# Altium integrated library Mastermind Devices.IntLib: 910 symbols (part 3 of 6)
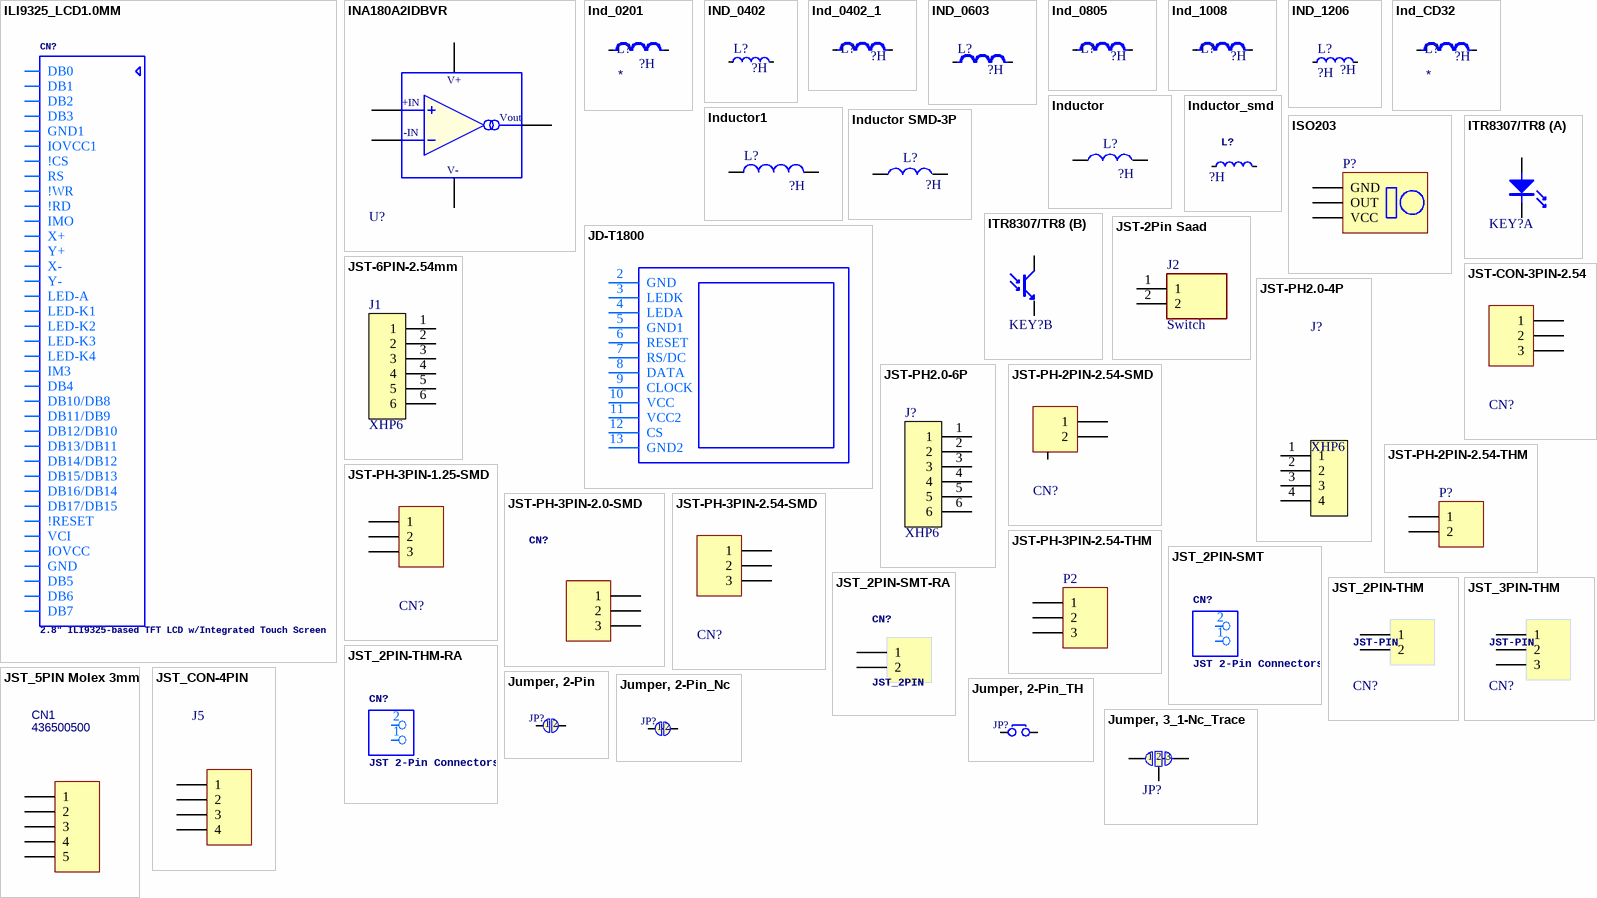
[diagram p41: symbols ILI9325_LCD1.0MM to Jumper, 3_1-Nc_Trace]

## Inductor
designator L?  value ?H  (hidden comment: *)
footprint I1206K - Inductor
footprint 82114R
footprint 0207/2V
footprint INDUCTOR_4X4MM_SMD
footprint INDUCTOR_7X7MM_SMD
footprint INDUCTOR_10X10MM_SMD - duplicate
footprint IND-SMD_L6.0-W6.0
footprint IND-SMD_L12.3-W12.3
footprint IND-SMD_L4.0-W4.0_SMNR4020
footprint TORIDAL-D27_W13
footprint TORIDAL-L48_W34
footprint TORIDAL-L66_W50
footprint SM5845
footprint TORIDAL-D13_3A
footprint IND-SMD_L5.8-W5.2
footprint INDUCTOR_14X14MM_SMD
pins: 1, 2

## Inductor1
designator L?  value ?H  (hidden comment: *)
Inductor; Code_IEC: 1005; Published: 8-Jun-2000; LatestRevisionDate: 29-May-2009; LatestRevisionNote: IPC-7351 Footprint Added.; PackageReference: 0402-A; Publisher: Altium Limited; PackageDescription: Chip Inductor; Code_JEITA: 0402
footprint 0402-A (Chip Inductor, Body 1.0x0.5mm, IPC High Density)
footprint INDC1608L (Chip Inductor, Body 1.6x0.8mm, IPC High Density)
footprint 2029 (Chip Inductor, Body 2.0x1.2mm, IPC High Density)
footprint 0603 (Chip Inductor, Body 0.6x0.3mm, IPC High Density)
footprint INDC3216 (Chip Inductor, Body 3.2x1.6mm, IPC High Density)
footprint INDC4532 (Chip Inductor, Body 4.5x3.2mm, IPC High Density)
simulation model INDUCTOR (Inductor)
signal-integrity model Inductor
pins: 1, 2

## Inductor SMD-3P
designator L?  value ?H  (hidden comment: *)
SMD-3P, Power Inductors ROHS
footprint IND-SMD_3P-L12.7-W12.5
footprint IND-SMD_3P-L27.9-W19.7-P10.43-LS27.9-BL-A
pins: 1, 2, 3 GND hidden to GND

## Inductor_smd
designator L?  value ?H  (hidden comment: *)
Chip inductor
footprint INDC-0603
pins: 1, 2

## ISO203
designator P?
Header, 3-Pin; LatestRevisionDate: 17-Jul-2002; LatestRevisionNote: Re-released for DXP Platform.; Publisher: Altium Limited
footprint ISO203 (Connector; Header; 3 Position)
pins: 1 GND, 2 OUT, 3 VCC

## ITR8307/TR8
designator KEY?  (value not drawn)
Manufacturer: EVERLIGHT(亿光); Supplier: LCSC; Manufacturer Part: ITR8307/TR8; Supplier Part: C67922; JLCPCB Part Class: Extended Part; spicePre: K; spiceSymbolName: ITR8307/TR8
footprint OPTO-4P-L3.4-W2.7-P1.30-LS4.6
part A pins: 1 K "Cathode", 2 A "Anode"
part B pins: 3 C "Collector", 4 E "Emitter"

## JD-T1800
designator LCD?
footprint JD-T1800
pins: 2 GND (power), 3 LEDK, 4 LEDA, 5 GND1 (power), 6 RESET, 7 RS/DC, 8 DATA, 9 CLOCK, 10 VCC (power), 11 VCC2 (power), 12 CS, 13 GND2 (power)

## JST-2Pin Saad
designator J2, comment Switch
Connector Header Through Hole 2 position 0.098 (2.50mm); DETAILS: Connector Header Through Hole 2 position 0.098" (2.50mm); MFG: JST Sales America Inc.; MFGPN: B2B-XH-A(LF)(SN); PACKAGE: CONN HEADER VERT 2POS 2.5MM; URL: https://www.digikey.com/en/products/detail/jst-sales-america-inc/B2B-XH-A-LF-SN/1651045?s=N4IgTCBcDaIEJjgWgBoAkkEEAUAZAYgJTYDKAcoSALoC%2BQA
footprint JST_B2B-XH-A(LF)(SN)
pins: 1, 2

## JST-6PIN-2.54mm
designator J1, comment XHP6
footprint JST_B6B-XH-A(LF)(SN)
pins: 1, 2, 3, 4, 5, 6

## JST-CON-3PIN-2.54
designator CN?, comment ZX-XH2.54-3PWT  (value not drawn)
Manufacturer: Megastar(兆星); Contributor: lcsc; Supplier: LCSC; Supplier Part: C7429672; Manufacturer Part: ZX-XH2.54-3PWT; JLCPCB Part Class: Extended Part; spicePre: C; spiceSymbolName: ZX-XH2.54-3PWT
footprint JST_B3B-XH-A(LF)(SN)
pins: 1, 2, 3

## JST-PH2.0-4P
designator J?, comment XHP6
footprint JST-PH2.0-4PINS
pins: 1, 2, 3, 4

## JST-PH2.0-6P
designator J?, comment XHP6
footprint JST-PH2.0-6PINS
pins: 1, 2, 3, 4, 5, 6

## JST-PH-2PIN-2.54-SMD
designator CN?, comment ZX-XH2.54-2PWT  (value not drawn)
Manufacturer: Megastar(兆星); Contributor: lcsc; Supplier: LCSC; Supplier Part: C7429671; Manufacturer Part: ZX-XH2.54-2PWT; JLCPCB Part Class: Extended Part; spicePre: C; spiceSymbolName: ZX-XH2.54-2PWT
footprint CONN-SMD_2P-P2.54_MEGASTAR_ZX-XH2.54-2PWT
pins: 1, 2, M

## JST-PH-2PIN-2.54-THM
designator P?, comment Header 2  (value not drawn)
Header, 2-Pin; LatestRevisionDate: 17-Jul-2002; LatestRevisionNote: Re-released for DXP Platform.; Publisher: Altium Limited
footprint JST-PH-2PIN-2.54-THM
pins: 1, 2

## JST-PH-3PIN-1.25-SMD
designator CN?, comment ZX-XH2.54-3PWT  (value not drawn)
Manufacturer: Megastar(兆星); Contributor: lcsc; Supplier: LCSC; Supplier Part: C7429672; Manufacturer Part: ZX-XH2.54-3PWT; JLCPCB Part Class: Extended Part; spicePre: C; spiceSymbolName: ZX-XH2.54-3PWT
footprint CONN-TH_SM03B-GHS-TB-LF-SN
pins: 1, 2, 3, 4 GND hidden to GND, 5 GND hidden to GND

## JST-PH-3PIN-2.0-SMD
designator CN?
footprint JSTPH3
pins: 1, 2, 3

## JST-PH-3PIN-2.54-SMD
designator CN?, comment ZX-XH2.54-3PWT  (value not drawn)
Manufacturer: Megastar(兆星); Contributor: lcsc; Supplier: LCSC; Supplier Part: C7429672; Manufacturer Part: ZX-XH2.54-3PWT; JLCPCB Part Class: Extended Part; spicePre: C; spiceSymbolName: ZX-XH2.54-3PWT
footprint CONN-SMD_3P-P2.54-XH2.54-WT
pins: 1, 2, 3, M GND hidden

## JST-PH-3PIN-2.54-THM
designator P2, comment Header 3  (value not drawn)
Header, 3-Pin; LatestRevisionDate: 17-Jul-2002; LatestRevisionNote: Re-released for DXP Platform.; Publisher: Altium Limited
footprint JST-PH-3PIN-2.54-THM
pins: 1, 2, 3

## JST_2PIN-SMT
designator CN?, comment JST 2-Pin Connectors of various flavors SMT-RA (S2B-PH-SM4) 4UConnector #17311  SMT  (B2B-PH-SM4)  THM-RA (S2B-PH)  THM  (B2B-PH)
footprint JST-PH-2-SMT
pins: 1 2, 2 1

## JST_2PIN-SMT-RA
designator CN?, comment JST_2PIN
JST 2-Pin Connectors of various flavors SMT-RA (S2B-PH-SM4) 4UConnector #17311  SMT  (B2B-PH-SM4)  THM-RA (S2B-PH)  THM  (B2B-PH)
footprint JST-PH-2-SMT-RA
pins: 1, 2

## JST_2PIN-THM
designator CN?, comment JST-PIN
footprint JST-2-PTH-THM - VERTICAL
pins: 1, 2

## JST_2PIN-THM-RA
designator CN?, comment JST 2-Pin Connectors of various flavors SMT-RA (S2B-PH-SM4) 4UConnector #17311  SMT  (B2B-PH-SM4)  THM-RA (S2B-PH)  THM  (B2B-PH)
footprint JST-PH-2-THM-RA
pins: 1 2, 2 1

## JST_3PIN-THM
designator CN?, comment JST-PIN
footprint JST-3-PTH-THM - VERTICAL
pins: 1, 2, 3

## JST_5PIN Molex 3mm
designator CN1, comment 436500500
BOM_Manufacturer: MOLEX; Contributor: LCSC; BOM_Supplier: LCSC; BOM_Supplier Part: C492351; BOM_Manufacturer Part: 436500500; BOM_JLCPCB Part Class: Extended Part; spicePre: C; spiceSymbolName: 436500500
footprint CONN-TH_436500500
pins: 1, 2, 3, 4, 5

## JST_CON-4PIN
designator J5
4 Position Wire to Board Terminal Block Horizontal with Board 0.100 _2.54mm_ Through Hole; DETAILS: Connector Header Through Hole 4 position 0.098" (2.50mm); MFG: JST Sales America Inc.; MFGPN: B4B-XH-A(LF)(SN); PACKAGE: 4POS 2.5MM; URL: https://www.digikey.com/en/products/detail/jst-sales-america-inc/B4B-XH-A-LF-SN/1651047
footprint JST_B4B-XH-A(LF)(SN)
pins: 1, 2, 3, 4

## Jumper, 2-Pin
designator JP?, comment GND  (value not drawn)  (no BOM)
Jumper, 2-Pin
footprint JUMPER-SB
footprint Jumper-NO
footprint SB_0603 (Jumper)
pins: 1, 2

## Jumper, 2-Pin_Nc
designator JP?, comment Shorting Link  (value not drawn)  (no BOM)
Jumper, 2-Pin
footprint Jumper-NC
footprint JUMPER-NC1
pins: 1, 2

## Jumper, 2-Pin_TH
designator JP?, comment Jumper, 2-Pin  (value not drawn)
footprint JUMPER-2PIN
pins: 1, 2

## Jumper, 3_1-Nc_Trace
designator JP?, comment JUMPER-SMT_3_1-NC_TRACE_NO-SILK  (value not drawn)  (no BOM)
GateName_1: G$1; SymbolName_1: SMT-JUMPER_3_1-NC_TRACE; DeviceName: _NO-SILK; LibraryName: SparkFun-Jumpers; DeviceSetName: JUMPER-SMT_3_1-NC_TRACE
footprint JUMPER_3_2-NC_TRACE_SILK (SMT-JUMPER_3_2-NC_TRACE_SILK)
pins: 1, 2, 3

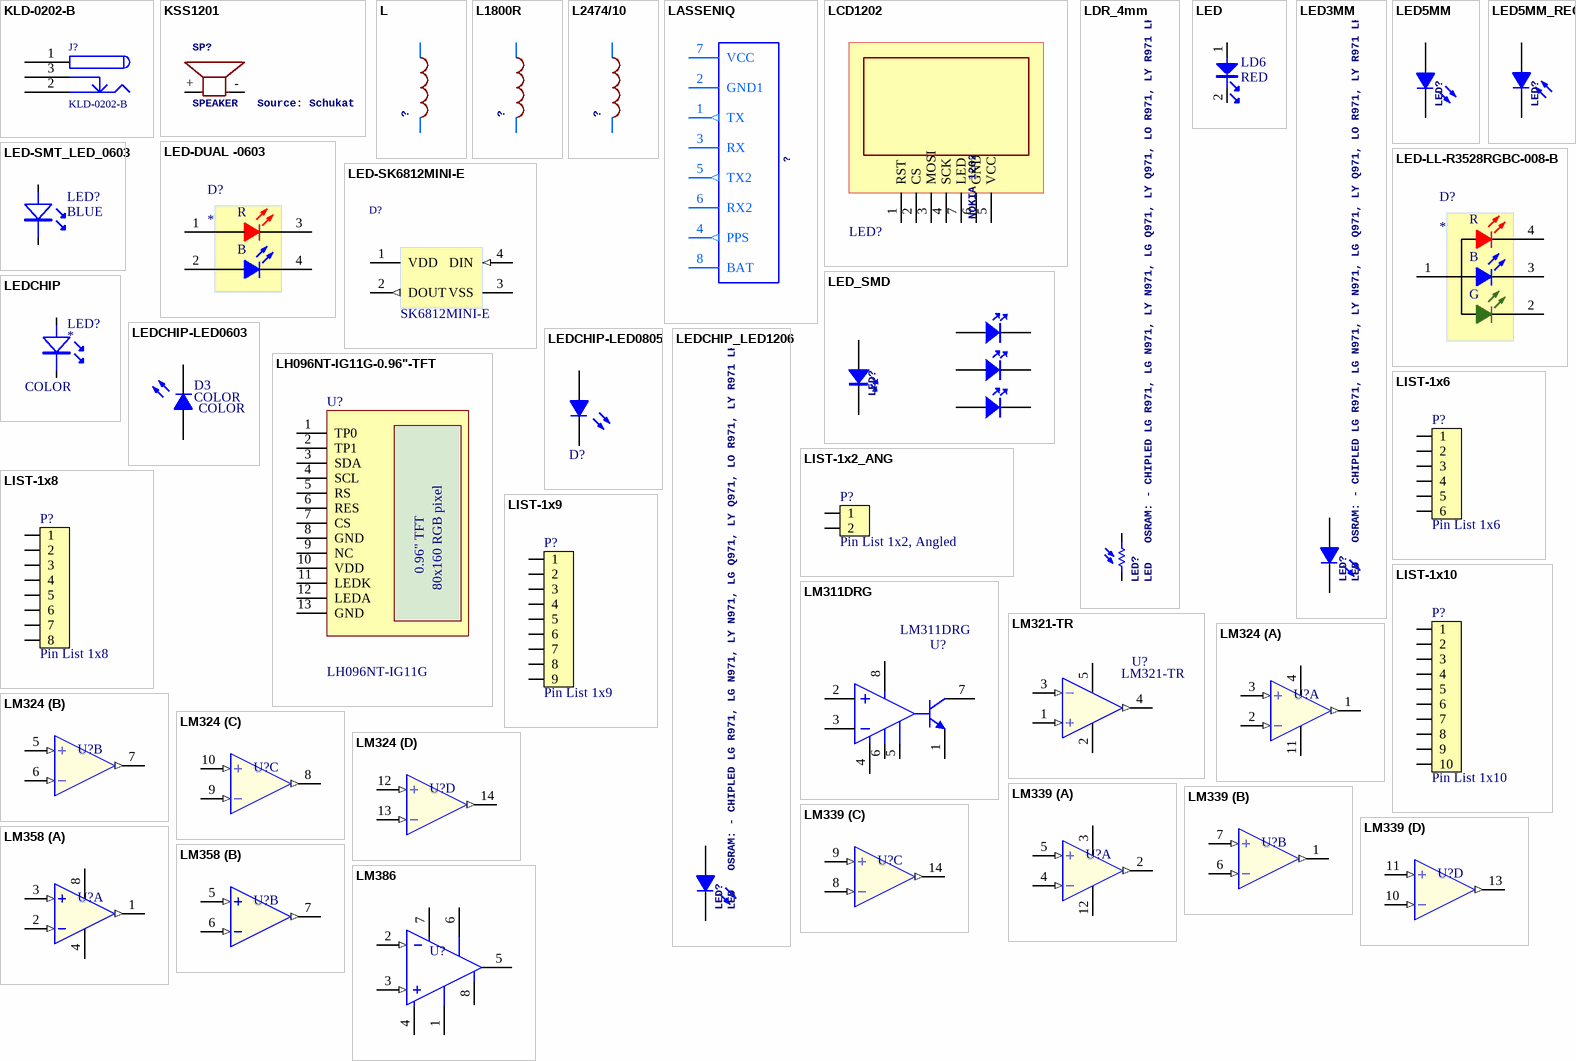
[diagram p16: symbols KLD-0202-B to LM386]

## KLD-0202-B
designator J?
Low Voltage Power Supply Connector; Manufacturer: Kycon; AEMS Code: 3510211
3D model power_jack (PCB3D Model)
footprint KLD-0202
pins: 1 (power), 2 (power), 3 (power)

## KSS1201
designator SP?, comment SPEAKER   Source: Schukat
OC_FARNELL: unknown; OC_NEWARK: unknown
footprint KSS1201
pins: + 1, - 2

## L
designator ?
footprint 6000
pins: 1, 2

## L1800R
designator ?
footprint 1800R
pins: 1, 2

## L2474/10
designator ?
footprint 2747
pins: P$1 1, P$2 2

## LASSENIQ
designator ?
footprint TRIMBLE
pins: 1 TX (out), 2 GND1 (oe), 3 RX, 4 PPS (out), 5 TX2 (out), 6 RX2, 7 VCC (oe), 8 BAT (oe)

## LCD1202
designator LED?, comment NOKIA 1202
footprint LCD1202
pins: 1 RST, 2 CS, 3 MOSI, 4 SCK, 5 VCC, 6 GND, 7 LED

## LDR_4mm
designator LED?, comment LED   OSRAM: - CHIPLED LG R971, LG N971, LY N971, LG Q971, LY Q971, LO R971, LY R971 LH N974, LH R974 LS Q976, LO Q976, LY Q976 LO Q996 - Hyper CHIPLED LW Q18S LB Q993, LB Q99A, LB R99A - SideLED LS A670, LO A670, LY A670, LG A670, LP A670 LB A673, LV A673, LT A673, LW A673 LH A674 LY A675 LS A676, LA A676, LO A676, LY A676, LW A676 LS A679, LY A679, LG A679 -  Hyper Micro SIDELEDÂ® LS Y876, LA Y876, LO Y876, LY Y876 LT Y87S - SmartLED LW L88C, LW L88S LB L89C, LB L89S, LG L890 LS L89K, LO L89K, LY L89K LS L896, LA L896, LO L896, LY L896 - TOPLED LS T670, LO T670, LY T670, LG T670, LP T670 LSG T670, LSP T670, LSY T670, LOP T670, LYG T670 LG T671, LOG T671, LSG T671 LB T673, LV T673, LT T673, LW T673 LH T674 LS T676, LA T676, LO T676, LY T676, LB T676, LH T676, LSB T676, LW T676 LB T67C, LV T67C, LT T67C, LS T67K, LO T67K, LY T67K, LW E67C LS E67B, LA E67B, LO E67B, LY E67B, LB E67C, LV E67C, LT E67C LW T67C LS T679, LY T679, LG T679 LS T770, LO T770, LY T770, LG T770, LP T770 LB T773, LV T773, LT T773, LW T773 LH T774 LS E675, LA E675, LY E675, LS T675 LS T776, LA T776, LO T776, LY T776, LB T776 LHGB T686 LT T68C, LB T68C - Hyper Mini TOPLEDÂ® LB M676 - Mini TOPLED SantanaÂ® LG M470 LS M47K, LO M47K, LY M47K    Source: http://www.osram.convergy.de/
footprint LDR-4mm
pins: 1, 2

## LED
designator LD6, comment RED
Manuf_Part_1: 19-213-R6C-AP1Q2B-3T; Manuf_1: EVERLIGHT
pins: 1, 2
2 alternate drawings of the same symbol

## LED3MM
designator LED?, comment LED   OSRAM: - CHIPLED LG R971, LG N971, LY N971, LG Q971, LY Q971, LO R971, LY R971 LH N974, LH R974 LS Q976, LO Q976, LY Q976 LO Q996 - Hyper CHIPLED LW Q18S LB Q993, LB Q99A, LB R99A - SideLED LS A670, LO A670, LY A670, LG A670, LP A670 LB A673, LV A673, LT A673, LW A673 LH A674 LY A675 LS A676, LA A676, LO A676, LY A676, LW A676 LS A679, LY A679, LG A679 -  Hyper Micro SIDELEDÂ® LS Y876, LA Y876, LO Y876, LY Y876 LT Y87S - SmartLED LW L88C, LW L88S LB L89C, LB L89S, LG L890 LS L89K, LO L89K, LY L89K LS L896, LA L896, LO L896, LY L896 - TOPLED LS T670, LO T670, LY T670, LG T670, LP T670 LSG T670, LSP T670, LSY T670, LOP T670, LYG T670 LG T671, LOG T671, LSG T671 LB T673, LV T673, LT T673, LW T673 LH T674 LS T676, LA T676, LO T676, LY T676, LB T676, LH T676, LSB T676, LW T676 LB T67C, LV T67C, LT T67C, LS T67K, LO T67K, LY T67K, LW E67C LS E67B, LA E67B, LO E67B, LY E67B, LB E67C, LV E67C, LT E67C LW T67C LS T679, LY T679, LG T679 LS T770, LO T770, LY T770, LG T770, LP T770 LB T773, LV T773, LT T773, LW T773 LH T774 LS E675, LA E675, LY E675, LS T675 LS T776, LA T776, LO T776, LY T776, LB T776 LHGB T686 LT T68C, LB T68C - Hyper Mini TOPLEDÂ® LB M676 - Mini TOPLED SantanaÂ® LG M470 LS M47K, LO M47K, LY M47K    Source: http://www.osram.convergy.de/
footprint LED3MM
pins: A, K

## LED5MM
designator LED?
footprint LED5MM
footprint LED5MM1
pins: A, K

## LED5MM_REC
designator LED?
footprint LED5MM
footprint LED5MM1
pins: A, K

## LED-DUAL -0603
designator D?
0603 1.6*1.5mm; MF: Lucky Light; MP: LL-R3528RGBC-008-B; Package: PLCC-2 Lucky Light; Availability: Unavailable; Value: *; SnapEDA_Link: https://www.snapeda.com/parts/LL-R3528RGBC-008-B/Lucky%20Light/view-part/47649/?ref=snap; Price: None
footprint LED_DUAL_0606 - touch
footprint LED_DUAL_0606
pins: 1 A, 2 A, 3 K, 4 K
text: R; B

## LED-LL-R3528RGBC-008-B
designator D?
LED; SMD; 3528, PLCC2; RGB; 3.5x2.8mm; 120Â°; Red lumin: 1; MF: Lucky Light; MP: LL-R3528RGBC-008-B; Package: PLCC-2 Lucky Light; Availability: Unavailable; Value: *; SnapEDA_Link: https://www.snapeda.com/parts/LL-R3528RGBC-008-B/Lucky%20Light/view-part/47649/?ref=snap; Price: None
footprint LED_LL-R3528RGBC-008-B
pins: 1 A, 2 K, 3 K, 4 K
text: R; B; G

## LED-SK6812MINI-E
designator D?  Name: SK6812MINI-E
SMD RGB LED
footprint LED_SK6812MINI-E
pins: 1 VDD, 2 DOUT (out), 3 VSS, 4 DIN (in)

## LED-SMT_LED_0603
designator LED?, comment BLUE
SMT LED
footprint CHIPLED_0603
pins: A, C K

## LED_SMD
designator LED?, comment LED   OSRAM: - CHIPLED LG R971, LG N971, LY N971, LG Q971, LY Q971, LO R971, LY R971 LH N974, LH R974 LS Q976, LO Q976, LY Q976 LO Q996 - Hyper CHIPLED LW Q18S LB Q993, LB Q99A, LB R99A - SideLED LS A670, LO A670, LY A670, LG A670, LP A670 LB A673, LV A673, LT A673, LW A673 LH A674 LY A675 LS A676, LA A676, LO A676, LY A676, LW A676 LS A679, LY A679, LG A679 -  Hyper Micro SIDELEDÂ® LS Y876, LA Y876, LO Y876, LY Y876 LT Y87S - SmartLED LW L88C, LW L88S LB L89C, LB L89S, LG L890 LS L89K, LO L89K, LY L89K LS L896, LA L896, LO L896, LY L896 - TOPLED LS T670, LO T670, LY T670, LG T670, LP T670 LSG T670, LSP T670, LSY T670, LOP T670, LYG T670 LG T671, LOG T671, LSG T671 LB T673, LV T673, LT T673, LW T673 LH T674 LS T676, LA T676, LO T676, LY T676, LB T676, LH T676, LSB T676, LW T676 LB T67C, LV T67C, LT T67C, LS T67K, LO T67K, LY T67K, LW E67C LS E67B, LA E67B, LO E67B, LY E67B, LB E67C, LV E67C, LT E67C LW T67C LS T679, LY T679, LG T679 LS T770, LO T770, LY T770, LG T770, LP T770 LB T773, LV T773, LT T773, LW T773 LH T774 LS E675, LA E675, LY E675, LS T675 LS T776, LA T776, LO T776, LY T776, LB T776 LHGB T686 LT T68C, LB T68C - Hyper Mini TOPLEDÂ® LB M676 - Mini TOPLED SantanaÂ® LG M470 LS M47K, LO M47K, LY M47K    Source: http://www.osram.convergy.de/  (value not drawn)
footprint CHIPLED_0603
pins: A, A, A, A, C K, C K, C K, C K

## LEDCHIP
designator LED?  value COLOR
SMD lamp beads
footprint CHIP-LED0603
footprint CHIPLED_0603
footprint KA-3528ASYC
footprint CHIPLED_0603 - NO
footprint CHIP-LED0805-NO
footprint CHIP-LED0805
pins: A, C K

## LEDCHIP-LED0603
designator D3, comment COLOR
SMD lamp beads; Value: COLOR
footprint CHIP-LED0603
footprint CHIPLED_0603
footprint KA-3528ASYC
footprint CHIPLED_0603 - NO
pins: A, C K

## LEDCHIP-LED0805
designator D?  (value not drawn)
SMD Lamp beads; Value: COLOR
footprint CHIP-LED0805
footprint CHIP-LED0805-NO
pins: A, C

## LEDCHIP_LED1206
designator LED?, comment LED   OSRAM: - CHIPLED LG R971, LG N971, LY N971, LG Q971, LY Q971, LO R971, LY R971 LH N974, LH R974 LS Q976, LO Q976, LY Q976 LO Q996 - Hyper CHIPLED LW Q18S LB Q993, LB Q99A, LB R99A - SideLED LS A670, LO A670, LY A670, LG A670, LP A670 LB A673, LV A673, LT A673, LW A673 LH A674 LY A675 LS A676, LA A676, LO A676, LY A676, LW A676 LS A679, LY A679, LG A679 -  Hyper Micro SIDELEDÂ® LS Y876, LA Y876, LO Y876, LY Y876 LT Y87S - SmartLED LW L88C, LW L88S LB L89C, LB L89S, LG L890 LS L89K, LO L89K, LY L89K LS L896, LA L896, LO L896, LY L896 - TOPLED LS T670, LO T670, LY T670, LG T670, LP T670 LSG T670, LSP T670, LSY T670, LOP T670, LYG T670 LG T671, LOG T671, LSG T671 LB T673, LV T673, LT T673, LW T673 LH T674 LS T676, LA T676, LO T676, LY T676, LB T676, LH T676, LSB T676, LW T676 LB T67C, LV T67C, LT T67C, LS T67K, LO T67K, LY T67K, LW E67C LS E67B, LA E67B, LO E67B, LY E67B, LB E67C, LV E67C, LT E67C LW T67C LS T679, LY T679, LG T679 LS T770, LO T770, LY T770, LG T770, LP T770 LB T773, LV T773, LT T773, LW T773 LH T774 LS E675, LA E675, LY E675, LS T675 LS T776, LA T776, LO T776, LY T776, LB T776 LHGB T686 LT T68C, LB T68C - Hyper Mini TOPLEDÂ® LB M676 - Mini TOPLED SantanaÂ® LG M470 LS M47K, LO M47K, LY M47K    Source: http://www.osram.convergy.de/
Value: COLOR
footprint CHIPLED_1206
pins: A, C

## LH096NT-IG11G-0.96"-TFT
designator U?, comment LH096NT-IG11G
TFT ST7735S Display ROHS; Manufacturer: Newvision(新智景); Symbol: N087-2832TSWYG02-H14; Add into BOM: yes; Device: N087-2832TSWYG02-H14; LCSC Part Name: 0.87寸 白光 128x32像素分辨率 14PIN; Manufacturer Part: N087-2832TSWYG02-H14; Supplier Footprint: -; JLCPCB Part Class: Extended Part; Datasheet: https://atta.szlcsc.com/upload/public/pdf/source/20220801/014279878C5155A8BB30742A627C84A8.pdf; Supplier: LCSC; Convert to PCB: yes
footprint LH096NT-IG11G
pins: 1 TP0, 2 TP1, 3 SDA, 4 SCL, 5 RS, 6 RES, 7 CS, 8 GND, 9 NC, 10 VDD, 11 LEDK, 12 LEDA, 13 GND
text: 0.96" TFT; 80x160 RGB pixel

## LIST-1x2_ANG
designator P?, comment Pin List 1x2, Angled
Pin List 1x2, 2.54mm (100mil), Right Angled, SMD; Part Number: Pin List Ang 1x2 SMD, 2.54mm; Manufacturer: W-CON; Manufacturer Part Number: 1125B-1102S0ZZ135R1; 2nd source part number: TSM-102-01-L-SH-A; Artikkelnr Noca: 55010023; Artikkelnr Simpro: N.A.; Datasheet: \\hizz\pro\app9717\Datasheet\connectores\W-CON\1125B-11XXXXZXXXXX.pdf; Footprint Doc: LIST_ANG_1x2-SMD-2.54MM; LatestRevisionDate: 2016-01-22; Pin Count: 2; Publisher: Nordic Semiconductor; Published: 2016-01-22; Value: Pin List 1x2, Angled; Note: *; Supplier: Cabcon; Supplier part number: 1125B-1102S0ZZ135R1; 2nd source Supplier: Samtec
footprint LIST_ANG_1x2-SMD-2.54MM
pins: 1, 2

## LIST-1x6
designator P?, comment Pin List 1x6
Pin List 1x6, 2.54mm (100mil), SMD; Part Number: Pin List 1x6 SMD; Note: Not mounted; Artikkelnr Noca: 55019252; Artikkelnr Simpro: N.A.; Manufacturer: *; Manufacturer Part Number: *; Datasheet: *; LatestRevisionDate: 2013-08-27; Pin Count: 6; Publisher: Nordic Semiconductor; Published: 2013-08-27; Value: Pin List 1x6; Supplier: Samtec; Supplier part number: TSM-106-01-L-SV-P-TR; 2nd source Supplier: *; 2nd source part number: *; Footprint Doc: LIST_1x6_SMD
footprint LIST_1x6_SMD
pins: 1, 2, 3 (power), 4 (power), 5 (power), 6 (power)

## LIST-1x8
designator P?, comment Pin List 1x8
Pin List 1x8, 2.54mm (100mil), SMD; Part Number: Pin List 1x8 SMD; Note: Not mounted; Artikkelnr Noca: 55019253; Artikkelnr Simpro: N.A.; Manufacturer: *; Manufacturer Part Number: *; Datasheet: *; LatestRevisionDate: 2013-08-27; Publisher: Nordic Semiconductor; Published: 2013-08-27; Value: Pin List 1x8; Supplier: Samtec; Supplier part number: TSM-108-01-L-SV-P-TR; 2nd source Supplier: *; 2nd source part number: *; Pin Count: 8; Footprint Doc: LIST_1x8_SMD
footprint LIST_1x8_SMD
pins: 1, 2, 3 (power), 4 (power), 5 (power), 6 (power), 7 (power), 8 (power)

## LIST-1x9
designator P?, comment Pin List 1x9
Pin List 1x9, 2.54mm (100mil), SMD; Part Number: Pin List 1x9 SMD; Artikkelnr Noca: N.A.; Manufacturer: *; Manufacturer Part Number: *; Datasheet: *; Footprint Doc: LIST_1x9_SMD; LatestRevisionDate: 2014-06-10; Pin Count: 9; Publisher: Nordic Semiconductor; Published: 2014-06-10; Value: Pin List 1x9; Note: *; Supplier: Samtec; Supplier part number: TSM-109-01-L-SV-P-TR; 2nd source Supplier: *; 2nd source part number: *; Artikkelnr Simpro: N.A.
footprint LIST_1x9_SMD
pins: 1, 2, 3 (power), 4 (power), 5 (power), 6 (power), 7 (power), 8 (power), 9 (power)

## LIST-1x10
designator P?, comment Pin List 1x10
Pin List 1x10, 2.54mm (100mil), SMD; Part Number: Pin List 1x10 SMD; Note: Not mounted; Artikkelnr Noca: 55019254; Artikkelnr Simpro: N.A.; Manufacturer: *; Manufacturer Part Number: *; Datasheet: *; LatestRevisionDate: 2013-08-27; Publisher: Nordic Semiconductor; Published: 2013-08-27; Value: Pin List 1x10; Supplier: Samtec; Supplier part number: TSM-110-01-L-SV-P-TR; 2nd source Supplier: *; 2nd source part number: *; Pin Count: 10; Footprint Doc: LIST_1x10_SMD
footprint LIST_1x10_SMD
pins: 1, 2, 3, 4, 5, 6, 7, 8, 9, 10

## LM311DRG
designator U?
SOP-8 Comparators ROHS; Manufacturer: HGC(深圳汉芯); Add into BOM: yes; Supply Voltage: 5V~30V；±15V; Symbol: LM311DRG; Device: LM311DRG; LCSC Part Name: LM311DRG; Supplier Part: C5145295; Manufacturer Part: LM311DRG; Supplier Footprint: SOP-8; JLCPCB Part Class: Extended Part; Datasheet: https://atta.szlcsc.com/upload/public/pdf/source/20240914/7C1DCCD7A7E5F6620E38F203319EAF55.pdf; Supplier: LCSC; Convert to PCB: yes
footprint SOP-8_L4.9-W3.9-P1.27-LS6.0-BL
3D model SOP-8_L4.9-W3.9-P1.27-LS6.0-BL-1
pins: 1 GND, 2 IN+, 3 IN-, 4 VEE, 5 BALANCE, 6 BAL/STRB, 7 OUT, 8 VCC

## LM321-TR
designator U?
Manufacturer: Gainsil(聚洵); Symbol: LM321-TR_C280706; Add into BOM: yes; Number of Circuits: 单路; Gain Bandwidth Product(GBP): 1MHz; Current - Input Bias(Ib): 45nA; Voltage - Input Offset(Vos): 5mV; Common Mode Rejection Ratio (CMRR): 70dB; Slew Rate(SR): 0.2V/us; Output Current: 60mA; Supply Voltage: 3V~28V; Supply Current: 2.5mA; Input Offset Voltage Drift (Vos TC): 7uV/℃; Device: LM321-TR_C280706; LCSC Part Name: LM321-TR; Supplier Part: C280706; Manufacturer Part: LM321-TR; Supplier Footprint: SOT-23-5; JLCPCB Part Class: Extended Part; Datasheet: https://atta.szlcsc.com/upload/public/pdf/source/20220610/93D198CC3B6D94061EE9119CC9A08BD3.pdf; Supplier: LCSC; Convert to PCB: yes; Operating Temperature: -25℃~+85℃
footprint SOT-23-5_L3.0-W1.7-P0.95-LS2.8-BL
footprint SOT23-5L
pins: 1 IN+ (in), 2 GND, 3 IN- (in), 4 OUT (out), 5 VCC

## LM324
designator U?  (value not drawn)
Four channels 15nA 0.5V/us 1.2MHz SOIC-14 Operational Amplifier ROHS
footprint TSSOP14
footprint SOIC127P600X175-14N
part A pins: 1 OA (out), 2 A- (in), 3 A+ (in), 4 VCC, 11 GND
part B pins: 5 B+ (in), 6 B- (in), 7 OB (out)
part C pins: 8 OC (out), 9 C- (in), 10 C+ (in)
part D pins: 12 D+ (in), 13 D- (in), 14 OD (out)

## LM339
designator U?, comment National LM3622 li-ion charger    http://www.ladyada.net/library/eagle  (value not drawn)
footprint TSSOP14
part A pins: 2 OA (out), 3 VCC, 4 A- (in), 5 A+ (in), 12 GND
part B pins: 1 OB (out), 6 B- (in), 7 B+ (in)
part C pins: 8 C- (in), 9 C+ (in), 14 OC (out)
part D pins: 10 D- (in), 11 D+ (in), 13 OD (out)

## LM358
designator U?  (value not drawn)
Dual Operational Amplifiers
footprint SOIC-8E (SOIC, 8-Leads, Body 4.90x3.90mm, Pitch 1.27mm, IPC Medium Density)
footprint DIL08-ROUND
part A pins: 1 OA (out), 2 A- (in), 3 A+ (in), 4 GND, 8 VCC
part B pins: 5 B+ (in), 6 B- (in), 7 OB (out)

## LM386
designator U?  (value not drawn)
Audio Amplifiers
footprint SOIC-8E (SOIC, 8-Leads, Body 4.90x3.90mm, Pitch 1.27mm, IPC Medium Density)
footprint DIL08-ROUND
pins: 1 OA, 2 A- (in), 3 A+ (in), 4 GND, 5 VCC, 6 VCC, 7 VCC, 8 VCC

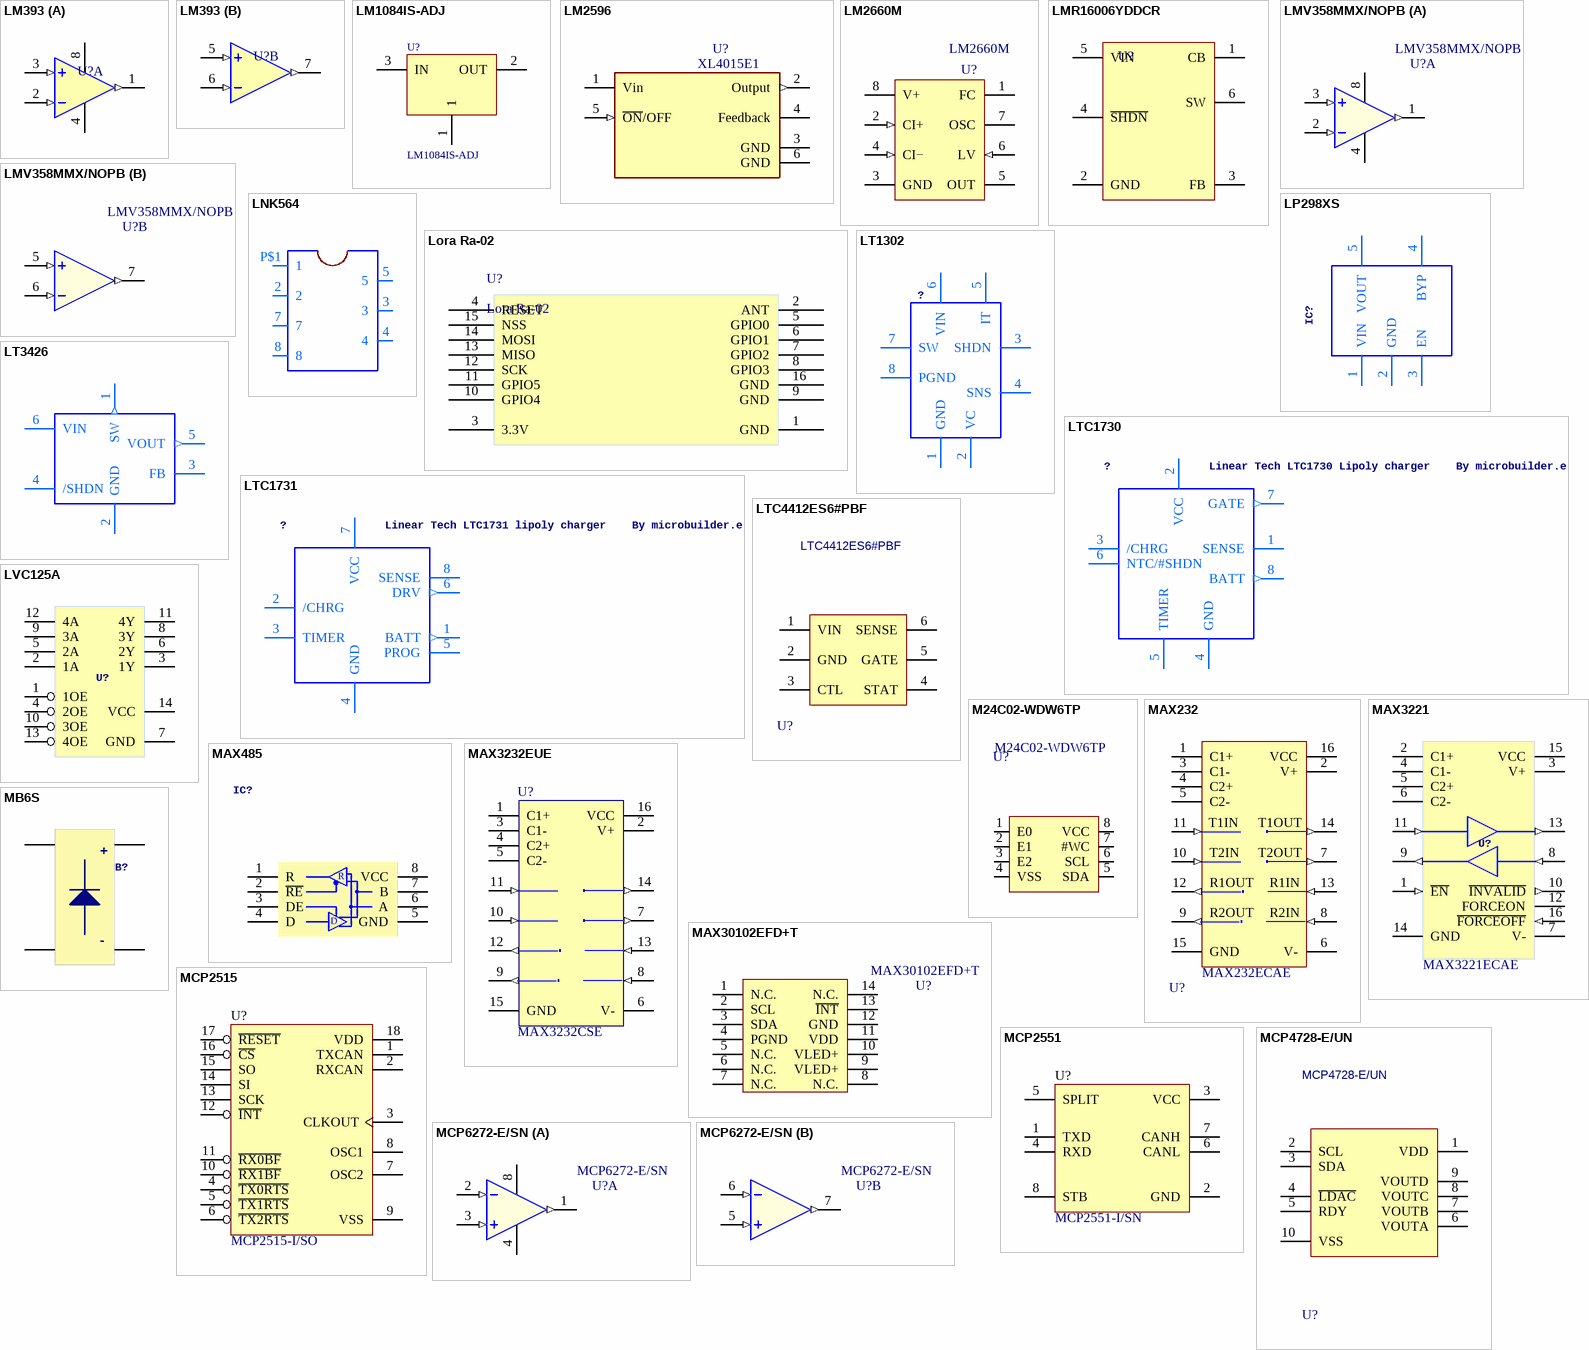
[diagram p17: symbols LM393 to MCP6272-E/SN]

## LM393
designator U?, comment LM393 OP AMP  (value not drawn)
Operational Amplifier
footprint SOP8
footprint DIL08-ROUND
part A pins: 1 OA (out), 2 A- (in), 3 A+ (in), 4 GND, 8 VCC
part B pins: 5 B+ (in), 6 B- (in), 7 OB (out)

## LM1084IS-ADJ
designator U?
5A Low Dropout Possitive Regulators
footprint TO-263
3D model to263 (PCB3D Model)
pins: 1 "Output", 2 OUT (power) "Output", 3 IN (power) "Input"

## LM2596
designator U?, comment XL4015E1
Step-down type Adjustable 5A 8V~36V TO-263-5 DC-DC Converters ROHS; Manufacturer: XLSEMI(芯龙); Add into BOM: yes; Switch tube (built-in/external): 内置; Symbol: XL4015E1; Device: XL4015E1; LCSC Part Name: XL4015E1; Supplier Part: C51661; Manufacturer Part: XL4015E1; Supplier Footprint: TO-263-5; JLCPCB Part Class: Extended Part; Datasheet: https://atta.szlcsc.com/upload/public/pdf/source/20150618/1457707323461.pdf; Supplier: LCSC; Convert to PCB: yes; Function: Step-down type; Input Voltage: -; Output Current (Max): -; Switching Frequency: -; Synchronous Rectification: -; Number of Outputs: -; Topology: -
footprint TO-263-5_L10.2-W8.9-P1.70-TL
pins: 1 Vin (power), 2 Output (out), 3 GND (power), 4 Feedback, 5 ~{ON}/OFF (in), 6 GND (power)

## LM2660M
designator U?
SOIC-8 Charge Pumps ROHS; Manufacturer: TI(德州仪器); Symbol: LM2660MX/NOPB; Add into BOM: yes; Device: LM2660MX/NOPB; LCSC Part Name: LM2660MX/NOPB; Supplier Part: C183083; Manufacturer Part: LM2660MX/NOPB; Supplier Footprint: SOIC-8; JLCPCB Part Class: Extended Part; Datasheet: https://www.ti.com/cn/lit/gpn/lm2660; Supplier: LCSC; Convert to PCB: yes
footprint SOIC-8_L4.9-W3.9-P1.27-LS6.0-BL
3D model SOIC-8_L4.9-W3.9-H1.7-LS6.0-P1.27
pins: 1 FC, 2 CI+ (in), 3 GND, 4 CI− (in), 5 OUT, 6 LV (in), 7 OSC, 8 V+

## LMR16006YDDCR
designator U?  (value not drawn)
BOM_Manufacturer: TI(Tex as Instruments); Contributor: LCSC; BOM_Supplier: LCSC; BOM_Supplier Part: C290195; BOM_Manufacturer Part: LMR16006YDDCR; BOM_JLCPCB Part Class: Extended Part; spicePre: U; spiceSymbolName: LMR16006YDDCR
footprint SOT23-6
pins: 1 CB, 2 GND, 3 FB, 4 ~{SHDN}, 5 VIN, 6 SW

## LMV358MMX/NOPB
designator U?
Manufacturer: TI(德州仪器); Add into BOM: yes; Number of Channels: Dual; Maximum Power Supply Range (Vdd-Vss): 5.5V; Input Offset Voltage Drift(Vos TC): 5uV/℃; Slew Rate: 1V/us; Ib - Input Bias Current: 15nA; Common Mode Rejection Ratio(CMRR): 65dB; Symbol: LMV358MMX; Device: LMV358MMX/NOPB; LCSC Part Name: 单/双/四通道通用低电压轨到轨输出运算放大器; Supplier Part: C7982; Manufacturer Part: LMV358MMX/NOPB; Supplier Footprint: VSSOP-8; JLCPCB Part Class: Extended Part; Datasheet: https://www.ti.com/cn/lit/gpn/lmv358-n; Supplier: LCSC; Convert to PCB: yes; Rail to Rail: -; Gain Bandwidth Product: -; Input Offset Current(Ios): -; Input offset current drift(Ios TC): -; Quiescent Current: -; Output Current: -; Operating Temperature: -40℃~+125℃
footprint VSSOP-8_L3.0-W3.0-P0.65-LS5.0-BL
3D model VSSOP-8_L3.0-W3.0-H1.1-LS4.9-P0.65
part A pins: 1 OA (out), 2 A- (in), 3 A+ (in), 4 GND, 8 VCC
part B pins: 5 B+ (in), 6 B- (in), 7 OB (out)

## LNK564
designator ?
footprint LNKPACKAGE
pins: 2, 3, 4, 5, 7, 8, P$1 1

## Lora Ra-02
designator U?
Lora Technology; IC: ESP8266-EX; Vendor: Ai-thinker; LatestReviewer: Zion Blue; Published: 14-Apr-2015; Publisher: Cynetik Group; LatestRevisionData: 14-Apr-2015; LatestRevisionNote: Include 3D body and Footprint
footprint Ra-02 (Lora module)
pins: 1 GND "Reset", 2 ANT "ADC Input Or TOUT Output", 3 3.3V "Chip enable", 4 RESET "GPIO16 or Deep-Sleep Wakeup", 5 GPIO0 "GPIO14 or SPI CLK", 6 GPIO1 "GPIO12 or SPIQ", 7 GPIO2 "GPIO13 or SPID", 8 GPIO3 "Power supply", 9 GND "Power ground", 10 GPIO4 "GPIO15 or SPICS", 11 GPIO5 "GPIO2 or TX", 12 SCK "GPIO0 or SPICS2", 13 MISO "GPIO5", 14 MOSI "GPIO4", 15 NSS "GPIO3 or UART RXD", 16 GND "GPIO1 or UART TXD"

## LP298XS
designator IC?
footprint SOT23-5L
pins: 1 VIN, 2 GND, 3 EN, 4 BYP, 5 VOUT

## LT1302
designator ?
footprint DIL08
pins: 1 GND, 2 VC, 3 SHDN, 4 SNS, 5 IT, 6 VIN, 7 SW, 8 PGND

## LT3426
designator ?, comment LT3426   1.2MHz, 2A boost converter in SOT-23    http://www.linear.com/pc/productDetail.jsp?navId=H0,C1,C1003,C1042,C1031,C1061,P8430 (Linear website)  (value not drawn)
footprint SOT23-6
pins: 1 SW (out), 2 GND (oe), 3 FB, 4 /SHDN, 5 VOUT (out), 6 VIN

## LTC1730
designator ?, comment Linear Tech LTC1730 Lipoly charger    By microbuilder.eu
footprint SO08
pins: 1 SENSE, 2 VCC (oe), 3 /CHRG, 4 GND (oe), 5 TIMER, 6 NTC/#SHDN, 7 GATE (out), 8 BATT (out)

## LTC1731
designator ?, comment Linear Tech LTC1731 lipoly charger    By microbuilder.eu
footprint SO08
pins: 1 BATT (out), 2 /CHRG, 3 TIMER, 4 GND (oe), 5 PROG, 6 DRV (out), 7 VCC (oe), 8 SENSE

## LTC4412ES6#PBF
designator U?
Manufacturer: ADI(亚德诺); Supplier: LCSC; Manufacturer Part: LTC4412ES6#PBF; Supplier Part: C107968; JLCPCB Part Class: Extended Part; spicePre: U; spiceSymbolName: LTC4412ES6#PBF
footprint SOT23-6
pins: 1 VIN, 2 GND, 3 CTL, 4 STAT, 5 GATE, 6 SENSE

## LVC125A
designator U?, comment Quad_shift_level_ic  (value not drawn)
74VHC125MCT
footprint TSSOP14
pins: 1 1OE, 2 1A, 3 1Y, 4 2OE, 5 2A, 6 2Y, 7 GND, 8 3Y, 9 3A, 10 3OE, 11 4Y, 12 4A, 13 4OE, 14 VCC

## M24C02-WDW6TP
designator U?
Manufacturer: ST(意法半导体); Add into BOM: yes; Interface Type: I2C; Memory Size: 2Kbit; Supply Voltage: 2.5V~5.5V; Symbol: M24C02-WDW6TP; Device: M24C02-WDW6TP; LCSC Part Name: M24C02-WDW6TP; Supplier Part: C283436; Manufacturer Part: M24C02-WDW6TP; Supplier Footprint: TSSOP-8; JLCPCB Part Class: Extended Part; Datasheet: https://atta.szlcsc.com/upload/public/pdf/source/20181022/C283437_E3FEDA2A944D3AAD319CAA3AA668BA2C.pdf; Supplier: LCSC; Convert to PCB: yes; Operating Temperature: -40℃~+85℃
footprint TSSOP-8_L4.4-W3.0-P0.65-LS6.4-BL
pins: 1 E0, 2 E1, 3 E2, 4 VSS, 5 SDA, 6 SCL, 7 #WC, 8 VCC

## MAX232
designator U?, comment SymbolName_1: MAX232ECAE  (hidden comment: RS232 TRANSCEIVER)
GateName_1: G$1
footprint SO-16
pins: 1 C1+, 2 V+ (power), 3 C1-, 4 C2+, 5 C2-, 6 V- (power), 7 T2OUT (out), 8 R2IN (in), 9 R2OUT (out), 10 T2IN (in), 11 T1IN (in), 12 R1OUT (out), 13 R1IN (in), 14 T1OUT (out), 15 GND (power), 16 VCC (power)

## MAX485
designator IC?  (value not drawn)
RS-485/RS-422 ICs ROHS
footprint SOP8
pins: 1 R, 2 ~{RE}, 3 DE, 4 D, 5 GND (power), 6 A, 7 B (power), 8 VCC (power)

## MAX3221
designator U?, comment SymbolName_1: MAX3221ECAE  (hidden comment: RS232 TRANSCEIVER)
GateName_1: G$1
footprint SSOP16
pins: 1 ~{EN} (in), 2 C1+, 3 V+, 4 C1-, 5 C2+, 6 C2-, 7 V-, 8 (in), 9 (out), 10 ~{INVALID} (out), 11 (in), 12 FORCEON, 13 (out), 14 GND, 15 VCC, 16 ~{FORCEOFF} (in)

## MAX3232EUE
designator U?, comment MAX3232CSE
3.0V TO 5.5V, Low-Power, up to 1Mbps, True RS-232 Transceiver Using Four 0.1µF External Capacitor; Manufacturer: Maxim,ST; Package Information: Latest Revision: 21-0066 C; Class I: Communication; Published: 16-Jan-2001; Revision: July-2002: Re-released for DXP Platform.; Datasheet: Latest Revision: Mar-1999; Package Reference: TSSOP16; Publisher: Altium Limited; Class II: Transceiver; Fitted: True
footprint SO-16
pins: 1 C1+, 2 V+ (power), 3 C1-, 4 C2+, 5 C2-, 6 V- (power), 7 T2OUT (out), 8 R2IN (in), 9 R2OUT (out), 10 T2IN (in), 11 T1IN (in), 12 R1OUT (out), 13 R1IN (in), 14 T1OUT (out), 15 GND (power), 16 VCC (power)

## MAX30102EFD+T
designator U?
OESIP-14 Heart Rate Sensors ROHS; Manufacturer: ADI(亚德诺)/MAXIM(美信); Symbol: MAX30102EFD+T_C6454833; Add into BOM: yes; Device: MAX30102EFD+T_C6454833; LCSC Part Name: MAX30102EFD+T; Supplier Part: C6454833; Manufacturer Part: MAX30102EFD+T; Supplier Footprint: OESIP-14; JLCPCB Part Class: Extended Part; Datasheet: https://atta.szlcsc.com/upload/public/pdf/source/20230523/5357A0E2EBB238F1082B332F3131EA1A.pdf; Supplier: LCSC; Convert to PCB: yes; Operating Temperature: -40℃~+85℃
footprint OESIP-14_L5.6-W3.3-P0.80-TL
3D model OESIP-14_L5.6-W3.3-P0.80-TL
pins: 1 N.C., 2 SCL, 3 SDA, 4 PGND, 5 N.C., 6 N.C., 7 N.C., 8 N.C., 9 VLED+, 10 VLED+, 11 VDD, 12 GND, 13 ~{INT}, 14 N.C.

## MB6S
designator B?
footprint MBS
pins: +, -, AC1, AC2

## MCP2515
designator U?, comment MCP2515-I/SO
1Mbps 2.7V~5.5V 5mA CAN Controller SOIC-18-300mil CAN Controllers ROHS; Manufacturer: Tokmas(托克马斯); Add into BOM: yes; Symbol: MCP2515-I; Device: MCP2515-I; Supplier: LCSC; Supplier Part: C5250735; Manufacturer Part: MCP2515-I; JLCPCB Part Class: Extended Part; LCSC Part Name: CAN芯片; Supplier Footprint: TSSOP-20; Datasheet: https://atta.szlcsc.com/upload/public/pdf/source/20221108/54102364C5045B746FF767DA10992A5D.pdf; Convert to PCB: yes
footprint SOIC-18_L11.6-W7.5-P1.27-LS10.3-BL
pins: 1 TXCAN, 2 RXCAN, 3 CLKOUT, 4 ~{TX0RTS}, 5 ~{TX1RTS}, 6 ~{TX2RTS}, 7 OSC2, 8 OSC1, 9 VSS, 10 ~{RX1BF}, 11 ~{RX0BF}, 12 ~{INT}, 13 SCK, 14 SI, 15 SO, 16 ~{CS}, 17 ~{RESET}, 18 VDD

## MCP2551
designator U?, comment MCP2551-I/SN
1Mbps 365uA 5V 75mA CAN Transceiver SOIC-8 CAN Transceivers ROHS; Manufacturer: HGC(深圳汉芯); Symbol: TJA1050DRG; Add into BOM: yes; Device: TJA1050DRG; LCSC Part Name: TJA1050DRG; Supplier Part: C19723770; Manufacturer Part: TJA1050DRG; Supplier Footprint: SOP-8; JLCPCB Part Class: Extended Part; Datasheet: https://atta.szlcsc.com/upload/public/pdf/source/20231229/9EC40A6172CAB0350BF7AF3421F4DEBF.pdf; Supplier: LCSC; Convert to PCB: yes
footprint SOIC-8E (SOIC, 8-Leads, Body 4.90x3.90mm, Pitch 1.27mm, IPC Medium Density)
footprint SOIC-8_L4.9-W3.9-P1.27-LS6.0-BL
pins: 1 TXD, 2 GND, 3 VCC, 4 RXD, 5 SPLIT, 6 CANL, 7 CANH, 8 STB

## MCP4728-E/UN
designator U?
12Bit MSOP-10 Digital To Analog Converters (DACs); Manufacturer: MICROCHIP(美国微芯); Contributor: LCSC; Supplier: LCSC; Supplier Part: C108207; Manufacturer Part: MCP4728-E/UN; JLCPCB Part Class: Extended Part; spicePre: U; spiceSymbolName: MCP4728-E/UN
footprint MSOP-10_L3.0-W3.0-P0.50-LS5.0-TL
pins: 1 VDD, 2 SCL, 3 SDA, 4 ~{LDAC}, 5 RDY, 6 VOUTA, 7 VOUTB, 8 VOUTC, 9 VOUTD, 10 VSS

## MCP6272-E/SN
designator U?
Manufacturer: MICROCHIP(美国微芯); Add into BOM: yes; Number of Circuits: 双路; Gain Bandwidth Product(GBP): 2MHz; Current - Input Bias(Ib): 1pA; Slew Rate(SR): 0.9V/us; Output Current: 25mA; Symbol: MCP6272-E/SN; Device: MCP6272-E/SN; LCSC Part Name: MCP6272-E/SN; Supplier Part: C636301; Manufacturer Part: MCP6272-E/SN; Supplier Footprint: SOIC-8; JLCPCB Part Class: Extended Part; Datasheet: https://atta.szlcsc.com/upload/public/pdf/source/20200417/C515535_72B2759F45DBE71254DBF0F155102EE1.pdf; Supplier: LCSC; Convert to PCB: yes; -3db Bandwidth: -; Output Type: -; Rail to Rail: -; Operating Temperature: -40℃~+125℃
footprint SOIC-8_L4.9-W3.9-P1.27-LS6.0-BL
3D model SOIC-8_L4.9-W3.9-H1.7-LS6.0-P1.27
part A pins: 1 OA (out), 2 A- (in), 3 A+ (in), 4 GND, 8 VCC
part B pins: 5 B+ (in), 6 B- (in), 7 OB (out)

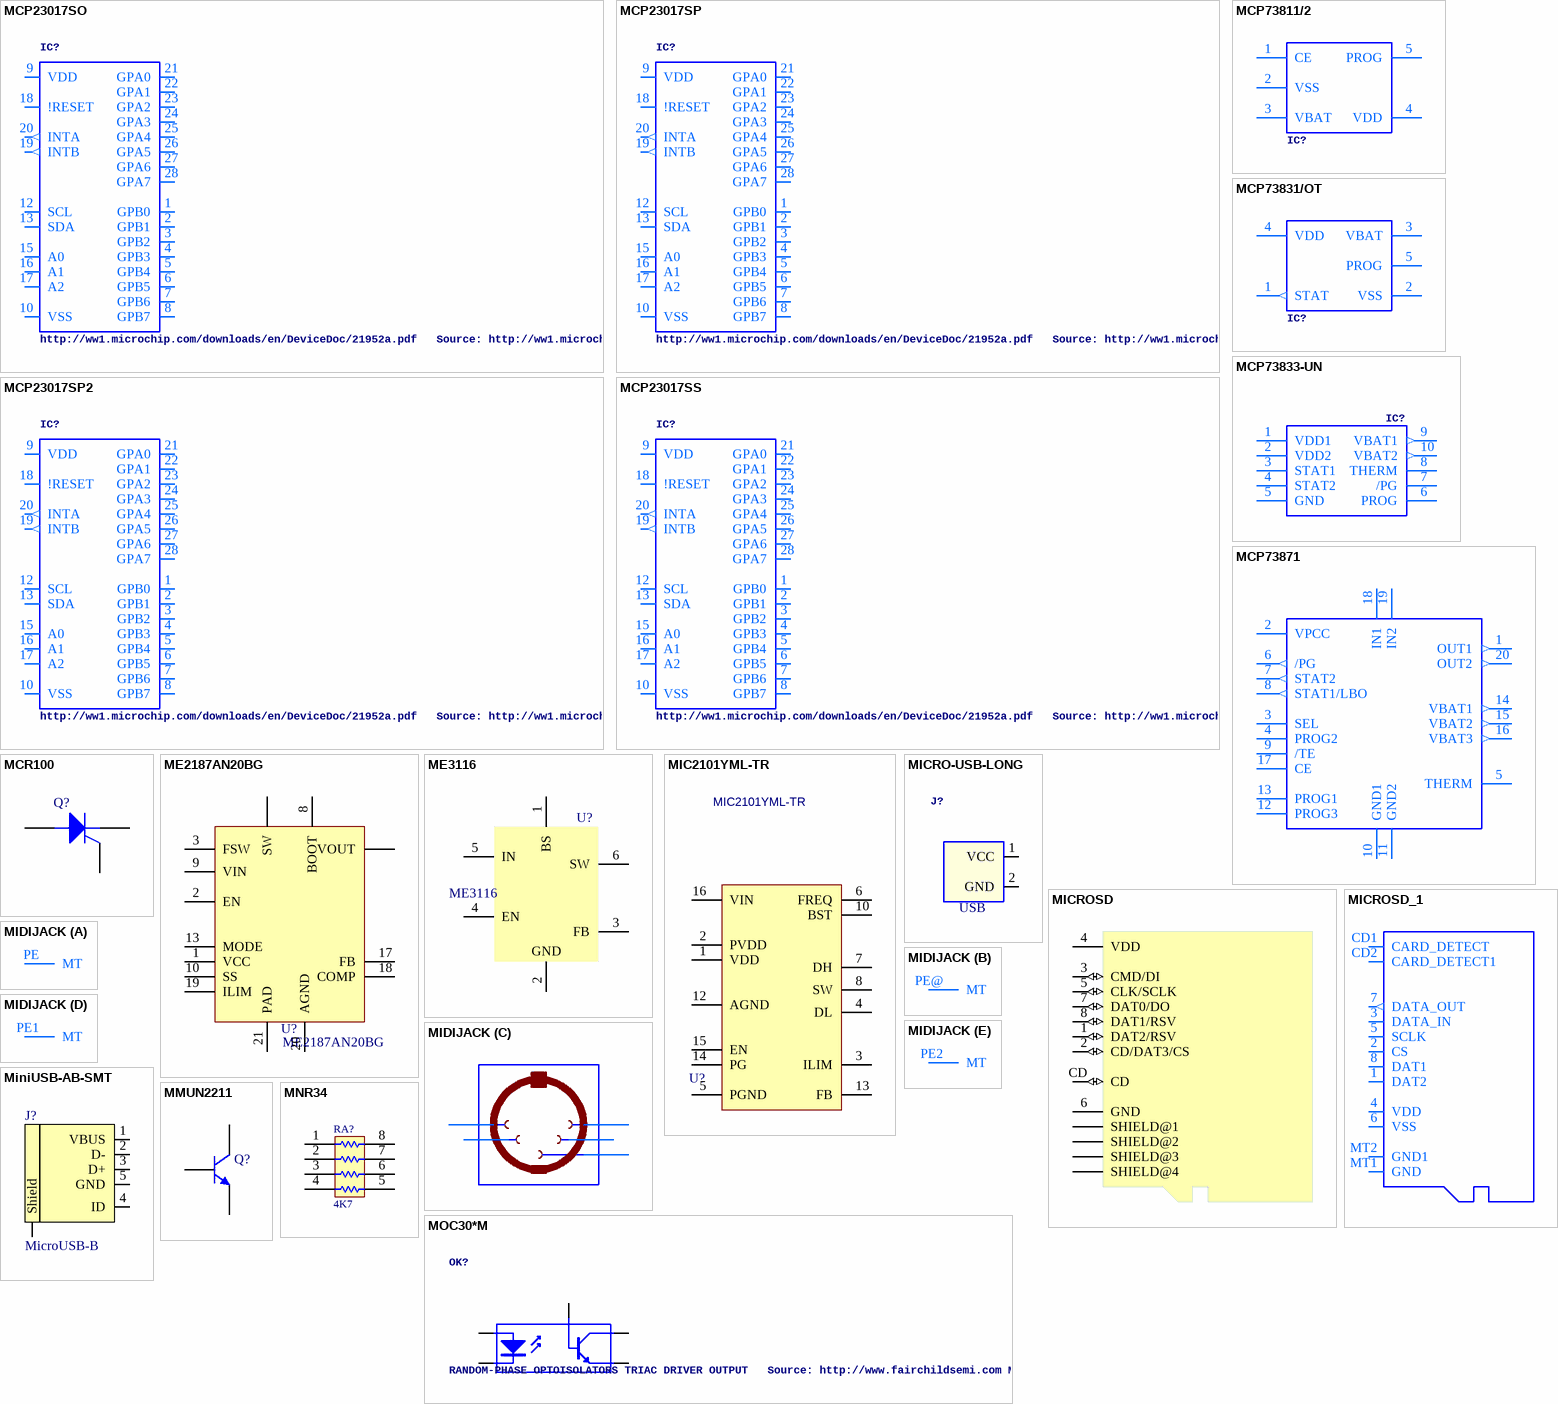
[diagram p18: symbols MCP23017SO to MOC30*M]

## MCP23017SO
designator IC?, comment http://ww1.microchip.com/downloads/en/DeviceDoc/21952a.pdf   Source: http://ww1.microchip.com/downloads/en/DeviceDoc/21952a.pdf
footprint SO28W
pins: 1 GPB0, 2 GPB1, 3 GPB2, 4 GPB3, 5 GPB4, 6 GPB5, 7 GPB6, 8 GPB7, 9 VDD (power), 10 VSS (power), 12 SCL, 13 SDA, 15 A0, 16 A1, 17 A2, 18 !RESET, 19 INTB (out), 20 INTA (out), 21 GPA0, 22 GPA1, 23 GPA2, 24 GPA3, 25 GPA4, 26 GPA5, 27 GPA6, 28 GPA7
